# Altium schematic symbol library Schlib.SchLib: 725 symbols (part 4 of 6)
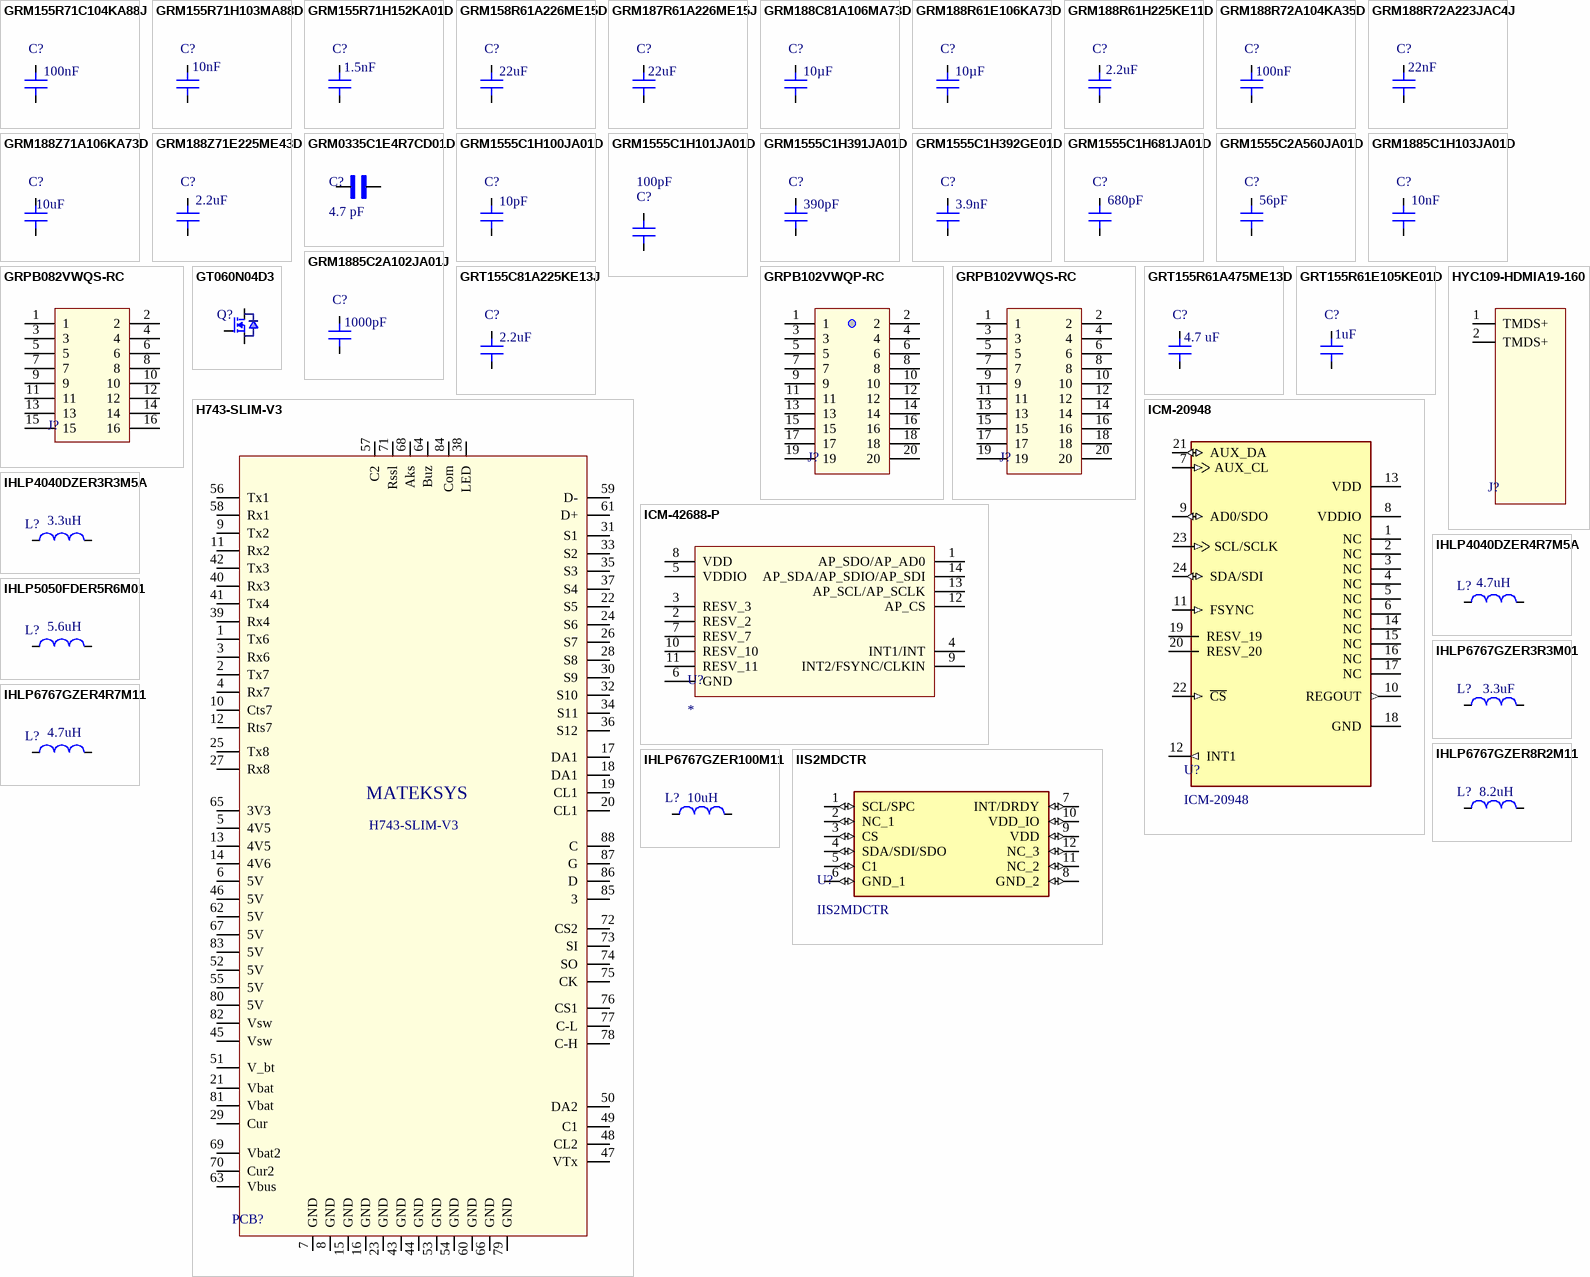
[diagram p24: symbols GRM155R71C104KA88J to IIS2MDCTR]

## GRT155R61A475ME13D
designator C?  value 4.7 uF  (hidden comment: *)
Cap, Aec-Q200, 4.7Uf, 10V, Mlcc, 0402 Rohs Compliant: Yes; Manufacturer: Murata; Manufacturer Part Number: GRT155R61A475ME13D; Supplier: Mouser; Supplier Part Number: 81-GRT155R61A475ME13; RoHS: Yes; Category: Ceramic Capacitors; Stock: 265246; Pricing: 1=0.16000, 10=0.07200, 50=0.07200, 100=0.04200, 1000=0.03300, 10000=0.02600 (USD); RoHS Compliant: Yes; Case/Package: 0402
footprint C 0402 (1005 Metric) (Chip Capacitor, Body 1.0x0.5mm, IPC High Density)
pins: 1 B, 2 A

## GRT155R61E105KE01D
designator C?  value 1uF  (hidden comment: *)
0402 1 uF 25 V ±10 % Tolerance X5R Surface Mount Multilayer Ceramic Capacitor; Manufacturer: Murata; Manufacturer Part Number: GRT155R61E105KE01D; Voltage Rating: 25V; Tolerance: 10%; Supplier: Digi-Key; Supplier Part Number: 490-12263-1-ND; RoHS: Yes; Category: Ceramic Capacitors; Stock: 639271; Pricing: 1=0.12000, 10=0.08400, 50=0.04780, 100=0.03950, 500=0.02772, 1000=0.02295, 2500=0.02136, 5000=0.01954 (USD); Mounting Technology: Surface Mount; Case/Package: 0402; Case Code (Metric): 1005; Case Code (Imperial): 0402; Min Operating Temperature: -55°C; Max Operating Temperature: 85°C; Packaging: Tape and Reel; Dielectric: X5R; Voltage Rating (DC): 25V; Length: 0.039inch; Width: 0.02inch; Thickness: 0.022inch; Ratings: AEC-Q200; RoHS Compliant: Yes; ComponentLink1URL: http://www.farnell.com/datasheets/2165918.pdf?src-supplier=Farnell; ComponentLink1Description: http://www.farnell.com/datasheets/2165918.pdf?src-supplier=Farnell; ComponentLink2URL: http://www.farnell.com/datasheets/2165918.pdf?src-supplier=Newark; ComponentLink2Description: http://www.farnell.com/datasheets/2165918.pdf?src-supplier=Newark; ComponentLink3URL: http://search.murata.co.jp/Ceramy/image/img/A01X/G101/ENG/GRT155R61E105KE01-01.pdf?src-supplier=Digi-Key; ComponentLink3Description: http://search.murata.co.jp/Ceramy/image/img/A01X/G101/ENG/GRT155R61E105KE01-01.pdf?src-supplier=Digi-Key; ComponentLink4URL: http://www.farnell.com/datasheets/2165918.pdf?src-supplier=Element14; ComponentLink4Description: http://www.farnell.com/datasheets/2165918.pdf?src-supplier=Element14
footprint C 0402 (1005 Metric) (Chip Capacitor, Body 1.0x0.5mm, IPC High Density)
pins: 1 B, 2 A

## GT060N04D3
designator Q?  (value not drawn)
N40V,RD(MAX)<6.5M@10V,RD(MAX)<10; Manufacturer: GoFord; Manufacturer Part Number: GT060N04D3; Supplier: Digi-Key; Supplier Part Number: 3141-GT060N04D3CT-ND; RoHS: No; Category: Uncategorized; Stock: 14940; Pricing: 1=0.75000, 10=0.66400, 100=0.50920, 500=0.40250, 1000=0.32200, 2000=0.29181 (USD); Case/Package: 8-PowerVDFN
pins: 1 S, 2 S, 3 S, 4 G, 5 D5, 6 D6, 7 D7, 8 D8

## H743-SLIM-V3
designator PCB?, comment MATEKSYS  (value not drawn)
MATEKSYS  Autopilot; Manufacturer Part Number: H743-SLIM-V3; Manufacturer: Matek
footprint Matek Flex board
pins: 1 Tx6, 2 Tx7, 3 Rx6, 4 Rx7, 5 4V5, 6 5V, 7 GND, 8 GND, 9 Tx2, 10 Cts7, 11 Rx2, 12 Rts7, 13 4V5, 14 4V6, 15 GND, 16 GND, 17 DA1, 18 DA1, 19 CL1, 20 CL1, 21 Vbat, 22 S5, 23 GND, 24 S6, 25 Tx8, 26 S7, 27 Rx8, 28 S8, 29 Cur, 30 S9, 31 S1, 32 S10, 33 S2, 34 S11, 35 S3, 36 S12, 37 S4, 38 LED, 39 Rx4, 40 Rx3, 41 Tx4, 42 Tx3, 43 GND, 44 GND, 45 Vsw, 46 5V, 47 VTx, 48 CL2, 49 C1, 50 DA2, 51 V_bt, 52 5V, 53 GND, 54 GND, 55 5V, 56 Tx1, 57 C2, 58 Rx1, 59 D-, 60 GND, 61 D+, 62 5V, 63 Vbus, 64 Buz, 65 3V3, 66 GND, 67 5V, 68 Aks, 69 Vbat2, 70 Cur2, 71 Rssl, 72 CS2, 73 SI, 74 SO, 75 CK, 76 CS1, 77 C-L, 78 C-H, 79 GND, 80 5V, 81 Vbat, 82 Vsw, 83 5V, 84 Com, 85 3, 86 D, 87 G, 88 C

## HYC109-HDMIA19-160
designator J?  (value not drawn)
HDMI Connector for PCB Male; Manufacturer Part Number: HYC109-HDMIA19-160
pins: 1 TMDS+, 2 TMDS+

## ICM-20948
designator U?
Accelerometer, Gyroscope, Magnetometer, 9 Axis Sensor I2C, SPI Output; Manufacturer Part Number: ICM-20948
footprint ICM-20948 (gyroscope)
pins: 1 NC, 2 NC, 3 NC, 4 NC, 5 NC, 6 NC, 7 AUX_CL (in), 8 VDDIO (power), 9 AD0/SDO (io), 10 REGOUT (out), 11 FSYNC (in), 12 INT1 (out), 13 VDD (power), 14 NC, 15 NC, 16 NC, 17 NC, 18 GND (power), 19 RESV_19, 20 RESV_20, 21 AUX_DA (io), 22 ~{CS} (in), 23 SCL/SCLK (in), 24 SDA/SDI (io)

## ICM-42688-P
designator U?
Accelerometer and Gyroscope 6-Axis MEMS Motion Tracking Device Digital-OUT 14-Pin LGA T/R; Manufacturer: TDK InvenSense; Manufacturer Part Number: ICM-42688-P; Sensor Type: Accelerometer,Gyroscope,6 Axis; Supplier: Rs; Supplier Part Number: 2182218; RoHS: No; Category: Inertial Measurement Units (IMUs); Stock: 58; Pricing: 2=7.075, 100=4.475, 500=3.79, 1000=3.69, 2500=3.6 (GBP); Series: -; ComponentLink1URL: https://media.digikey.com/pdf/Data%20Sheets/TDK%20PDFs/ICM-42688-P_DS_Rev1.2.pdf?src-supplier=Digi-Key; ComponentLink1Description: https://media.digikey.com/pdf/Data%20Sheets/TDK%20PDFs/ICM-42688-P_DS_Rev1.2.pdf?src-supplier=Digi-Key
footprint ICM-42688-P
pins: 1 AP_SDO/AP_AD0, 2 RESV_2, 3 RESV_3, 4 INT1/INT, 5 VDDIO, 6 GND, 7 RESV_7, 8 VDD, 9 INT2/FSYNC/CLKIN, 10 RESV_10, 11 RESV_11, 12 AP_CS, 13 AP_SCL/AP_SCLK, 14 AP_SDA/AP_SDIO/AP_SDI

## IHLP4040DZER3R3M5A
designator L?  value 3.3uH  (hidden comment: *)
Ind High Current Shielded Wirewound 3.3uH 20% 100KHz 11A 4040 T/R; Manufacturer: Vishay Dale; Manufacturer Part Number: IHLP4040DZER3R3M5A; Saturation Current: 12A; DC Resistance (DCR): 11.81mR; Supplier: Digi-Key; Supplier Part Number: 541-IHLP4040DZER3R3M5ACT-ND; RoHS: Yes; Category: Fixed Inductors; Stock: 750; Pricing: 1=1.60000, 10=1.48700, 25=1.37240, 50=1.14380, 100=1.07520, 250=0.96080 (USD); Mounting Technology: Surface Mount; Case/Package: 4040; Min Operating Temperature: -55°C; Max Operating Temperature: 125°C; Packaging: Tape and Reel; Package Quantity: 500; Tolerance: 20%; Current Rating: 11A; Shielding: Shielded; Max DC Current: 12A; Termination: SMD/SMT; Test Frequency: 100kHz; Series: IHLP-4040DZ-5A; Length: 0.425inch; Width: 10.3mm; Height: 4mm; Height - Seated (Max): 0.158inch; Depth: 10.3mm; Military Standard: Not; Lead Free: Lead Free; RoHS Compliant: Yes; ComponentLink1URL: https://datasheet.ciiva.com/15026/lp40dz5a-15026810.pdf?src-supplier=Digi-Key; ComponentLink1Description: https://datasheet.ciiva.com/15026/lp40dz5a-15026810.pdf?src-supplier=Digi-Key
footprint IHLP4040DZER3R3M5A (Precision Wire Wound Inductor, 2-Leads, Body 10.80x10.16mm, IPC Medium Density)
pins: 1 B, 2 A

## IHLP4040DZER4R7M5A
designator L?  value 4.7uH  (hidden comment: *)
Fixed Ind 4.7UH 9.8A 15.32 Mohm; Manufacturer: Vishay Dale; Manufacturer Part Number: IHLP4040DZER4R7M5A; Tolerance: 20%; Shielding: Shielded; Saturation Current: 9.2A; DC Resistance (DCR): 15.32mR; Test Frequency: 100kHz; Self Resonant Frequency: 20.1MHz; Supplier: Mouser; Supplier Part Number: 70-IHLP4040DZR4R7M5A; RoHS: Yes; Category: Fixed Inductors; Stock: 875; Pricing: 1=1.13, 10=0.927, 50=0.809, 100=0.763, 1000=0.605, 10000=0.547 (USD); Mounting Technology: Surface Mount; Case/Package: 4040; Min Operating Temperature: -55°C; Max Operating Temperature: 125°C; Packaging: Tape and Reel; Max DC Current: 9.2A; Termination: SMD/SMT; Series: IHLP-4040DZ-5A; Length: 10.92mm; Width: 10.3mm; Height: 4mm; Ratings: AEC-Q200; Lead Free: Lead Free; RoHS Compliant: Yes; ComponentLink1URL: https://datasheet.ciiva.com/15026/lp40dz5a-15026811.pdf?src-supplier=Digikey; ComponentLink1Description: https://datasheet.ciiva.com/15026/lp40dz5a-15026811.pdf?src-supplier=Digikey
footprint IHLP4040DZER4R7M5A (Precision Wire Wound Inductor, 2-Leads, Body 10.80x10.16mm, IPC Medium Density)
pins: 1 B, 2 A

## IHLP5050FDER5R6M01
designator L?  value 5.6uH  (hidden comment: *)
Inductor Power Shielded Wirewound 5.6uH 20% 100KHz Powdered Iron 13.5A 10mOhm DCR 5050 T/R; Manufacturer: Vishay; Manufacturer Part Number: IHLP5050FDER5R6M01; Supplier: Mouser; Supplier Part Number: 70-IHLP5050FDER5R6; RoHS: Yes; Category: Fixed Inductors; Stock: 1827; Pricing: 1=2.13, 10=1.59, 50=1.59, 100=1.14, 1000=0.996, 10000=0.996 (USD); ComponentLink1URL: https://datasheet.ciiva.com/3866/lp50fd01-3866012.pdf?src-supplier=Arrow+Electronics; ComponentLink1Description: https://datasheet.ciiva.com/3866/lp50fd01-3866012.pdf?src-supplier=Arrow+Electronics; ComponentLink2URL: https://datasheet.ciiva.com/16203/lp50fd01-16203837.pdf?src-supplier=Future+Electronics; ComponentLink2Description: https://datasheet.ciiva.com/16203/lp50fd01-16203837.pdf?src-supplier=Future+Electronics; ComponentLink3URL: https://datasheet.ciiva.com/22694/54939-22694507.pdf?src-supplier=Element14; ComponentLink3Description: https://datasheet.ciiva.com/22694/54939-22694507.pdf?src-supplier=Element14; ComponentLink4URL: https://datasheet.ciiva.com/8017/54939-8017423.pdf?src-supplier=Element14; ComponentLink4Description: https://datasheet.ciiva.com/8017/54939-8017423.pdf?src-supplier=Element14
footprint IHLP5050FDER5R6M01 (Precision Wire Wound Inductor, 2-Leads, Body 10.80x10.16mm, IPC Medium Density)
pins: 1 B, 2 A

## IHLP6767GZER3R3M01
designator L?  value 3.3uF  (hidden comment: *)
Inductor High Current Shielded Wirewound 3.3uH 20% 100KHz 28A 3.88mOhm DCR 6767 T/R; Manufacturer: Vishay Dale; Manufacturer Part Number: IHLP6767GZER3R3M01; Supplier: Mouser; Supplier Part Number: 70-IHLP6767GZER3R3M0; RoHS: Yes; Category: Fixed Inductors; Stock: 4019; Pricing: 1=4.06, 10=2.73, 50=2.73, 100=2.18, 1000=1.97, 10000=1.97 (USD); ComponentLink1URL: https://datasheet.ciiva.com/8017/482834-8017481.pdf?src-supplier=Element14; ComponentLink1Description: https://datasheet.ciiva.com/8017/482834-8017481.pdf?src-supplier=Element14; ComponentLink2URL: https://datasheet.ciiva.com/16299/lp67gz01-16299798.pdf?src-supplier=Future+Electronics; ComponentLink2Description: https://datasheet.ciiva.com/16299/lp67gz01-16299798.pdf?src-supplier=Future+Electronics
footprint IHLP6767GZER3R3M01 (Precision Wire Wound Inductor, 2-Leads, Body 10.80x10.16mm, IPC Medium Density)
pins: 1 B, 2 A

## IHLP6767GZER4R7M11
designator L?  value 4.7uH  (hidden comment: *)
Inductor High Current Shielded Wirewound 4.7uH 20% 100KHz 30A 4.18mOhm DCR 6767 T/R; Manufacturer: Vishay Dale; Manufacturer Part Number: IHLP6767GZER4R7M11; Supplier: Mouser; Supplier Part Number: 70-IHLP6767GZER4R7M1; RoHS: Yes; Category: Fixed Inductors; Stock: 1089; Pricing: 1=3.76, 10=2.65, 50=2.65, 100=2.34, 1000=2.15, 10000=2.15 (USD); ComponentLink1URL: https://datasheet.ciiva.com/7290/652622-7290288.pdf?src-supplier=Newark; ComponentLink1Description: https://datasheet.ciiva.com/7290/652622-7290288.pdf?src-supplier=Newark; ComponentLink2URL: https://datasheet.ciiva.com/1052/lp67gz11-1052670.pdf?src-supplier=Digikey; ComponentLink2Description: https://datasheet.ciiva.com/1052/lp67gz11-1052670.pdf?src-supplier=Digikey; ComponentLink3URL: https://datasheet.ciiva.com/1052/lp67gz11-1052671.pdf?src-supplier=Digikey; ComponentLink3Description: https://datasheet.ciiva.com/1052/lp67gz11-1052671.pdf?src-supplier=Digikey; ComponentLink4URL: https://datasheet.ciiva.com/1052/lp67gz11-1052672.pdf?src-supplier=Digikey; ComponentLink4Description: https://datasheet.ciiva.com/1052/lp67gz11-1052672.pdf?src-supplier=Digikey
footprint IHLP6767GZER4R7M11 (Precision Wire Wound Inductor, 2-Leads, Body 10.80x10.16mm, IPC Medium Density)
pins: 1 B, 2 A

## IHLP6767GZER8R2M11
designator L?  value 8.2uH  (hidden comment: *)
Inductor Power Shielded Wirewound 8.2uH 20% 100KHz Powdered Iron 21A 8.1mOhm DCR 6767 T/R; Manufacturer: Vishay Dale; Manufacturer Part Number: IHLP6767GZER8R2M11; ESR: 8.1mR; Supplier: Mouser; Supplier Part Number: 70-IHLP6767GZER8R2M1; RoHS: Yes; Category: Fixed Inductors; Stock: 1079; Pricing: 1=3.76, 10=2.65, 50=2.65, 100=2.11, 1000=1.92, 10000=1.92 (USD); ComponentLink1URL: https://datasheet.ciiva.com/11798/0900766b8102c93e-11798445.pdf?src-supplier=Rs; ComponentLink1Description: https://datasheet.ciiva.com/11798/0900766b8102c93e-11798445.pdf?src-supplier=Rs; ComponentLink2URL: https://datasheet.ciiva.com/8495/lp67gz11-8495789.pdf?src-supplier=Avnet; ComponentLink2Description: https://datasheet.ciiva.com/8495/lp67gz11-8495789.pdf?src-supplier=Avnet; ComponentLink3URL: https://datasheet.ciiva.com/1052/lp67gz11-1052757.pdf?src-supplier=Digikey; ComponentLink3Description: https://datasheet.ciiva.com/1052/lp67gz11-1052757.pdf?src-supplier=Digikey; ComponentLink4URL: https://datasheet.ciiva.com/1052/lp67gz11-1052758.pdf?src-supplier=Digikey; ComponentLink4Description: https://datasheet.ciiva.com/1052/lp67gz11-1052758.pdf?src-supplier=Digikey; ComponentLink5URL: https://datasheet.ciiva.com/1052/lp67gz11-1052759.pdf?src-supplier=Digikey; ComponentLink5Description: https://datasheet.ciiva.com/1052/lp67gz11-1052759.pdf?src-supplier=Digikey
footprint IHLP6767GZER8R2M11 (Precision Wire Wound Inductor, 2-Leads, Body 10.80x10.16mm, IPC Medium Density)
pins: 1 B, 2 A

## IHLP6767GZER100M11
designator L?  value 10uH  (hidden comment: *)
Inductor High Current Shielded Wirewound 10uH 20% 100KHz 19A 9.33mOhm DCR 6767 T/R; Manufacturer: Vishay Dale; Manufacturer Part Number: IHLP6767GZER100M11; Supplier: Mouser; Supplier Part Number: 70-IHLP6767GZER100M1; RoHS: Yes; Category: Fixed Inductors; Stock: 2320; Pricing: 1=3.74, 10=2.68, 50=2.68, 100=2.28, 1000=1.98, 10000=1.89 (USD); ComponentLink1URL: https://datasheet.ciiva.com/7290/1750656-7290283.pdf?src-supplier=Newark; ComponentLink1Description: https://datasheet.ciiva.com/7290/1750656-7290283.pdf?src-supplier=Newark; ComponentLink2URL: https://datasheet.ciiva.com/8495/lp67gz11-8495708.pdf?src-supplier=Avnet; ComponentLink2Description: https://datasheet.ciiva.com/8495/lp67gz11-8495708.pdf?src-supplier=Avnet; ComponentLink3URL: https://datasheet.ciiva.com/46386/1750656-46386780.pdf?src-supplier=Element14; ComponentLink3Description: https://datasheet.ciiva.com/46386/1750656-46386780.pdf?src-supplier=Element14; ComponentLink4URL: https://datasheet.ciiva.com/1052/lp67gz11-1052652.pdf?src-supplier=Digikey; ComponentLink4Description: https://datasheet.ciiva.com/1052/lp67gz11-1052652.pdf?src-supplier=Digikey; ComponentLink5URL: https://datasheet.ciiva.com/1052/lp67gz11-1052653.pdf?src-supplier=Digikey; ComponentLink5Description: https://datasheet.ciiva.com/1052/lp67gz11-1052653.pdf?src-supplier=Digikey; ComponentLink6URL: https://datasheet.ciiva.com/1052/lp67gz11-1052654.pdf?src-supplier=Digikey; ComponentLink6Description: https://datasheet.ciiva.com/1052/lp67gz11-1052654.pdf?src-supplier=Digikey; ComponentLink7URL: https://datasheet.ciiva.com/22710/1750656-22710508.pdf?src-supplier=Element14; ComponentLink7Description: https://datasheet.ciiva.com/22710/1750656-22710508.pdf?src-supplier=Element14
footprint IHLP6767GZER100M11 (Precision Wire Wound Inductor, 2-Leads, Body 10.80x10.16mm, IPC Medium Density)
pins: 1 B, 2 A

## IIS2MDCTR
designator U?
Magnetoresistive Sensor X, Y, Z Axis 12-LGA (2x2); Manufacturer Part Number: IIS2MDCTR
footprint IIS2MDCTR
pins: 1 SCL/SPC (io), 2 NC_1 (io), 3 CS (io), 4 SDA/SDI/SDO (io), 5 C1 (io), 6 GND_1 (io), 7 INT/DRDY (io), 8 GND_2 (io), 9 VDD (io), 10 VDD_IO (io), 11 NC_2 (io), 12 NC_3 (io)

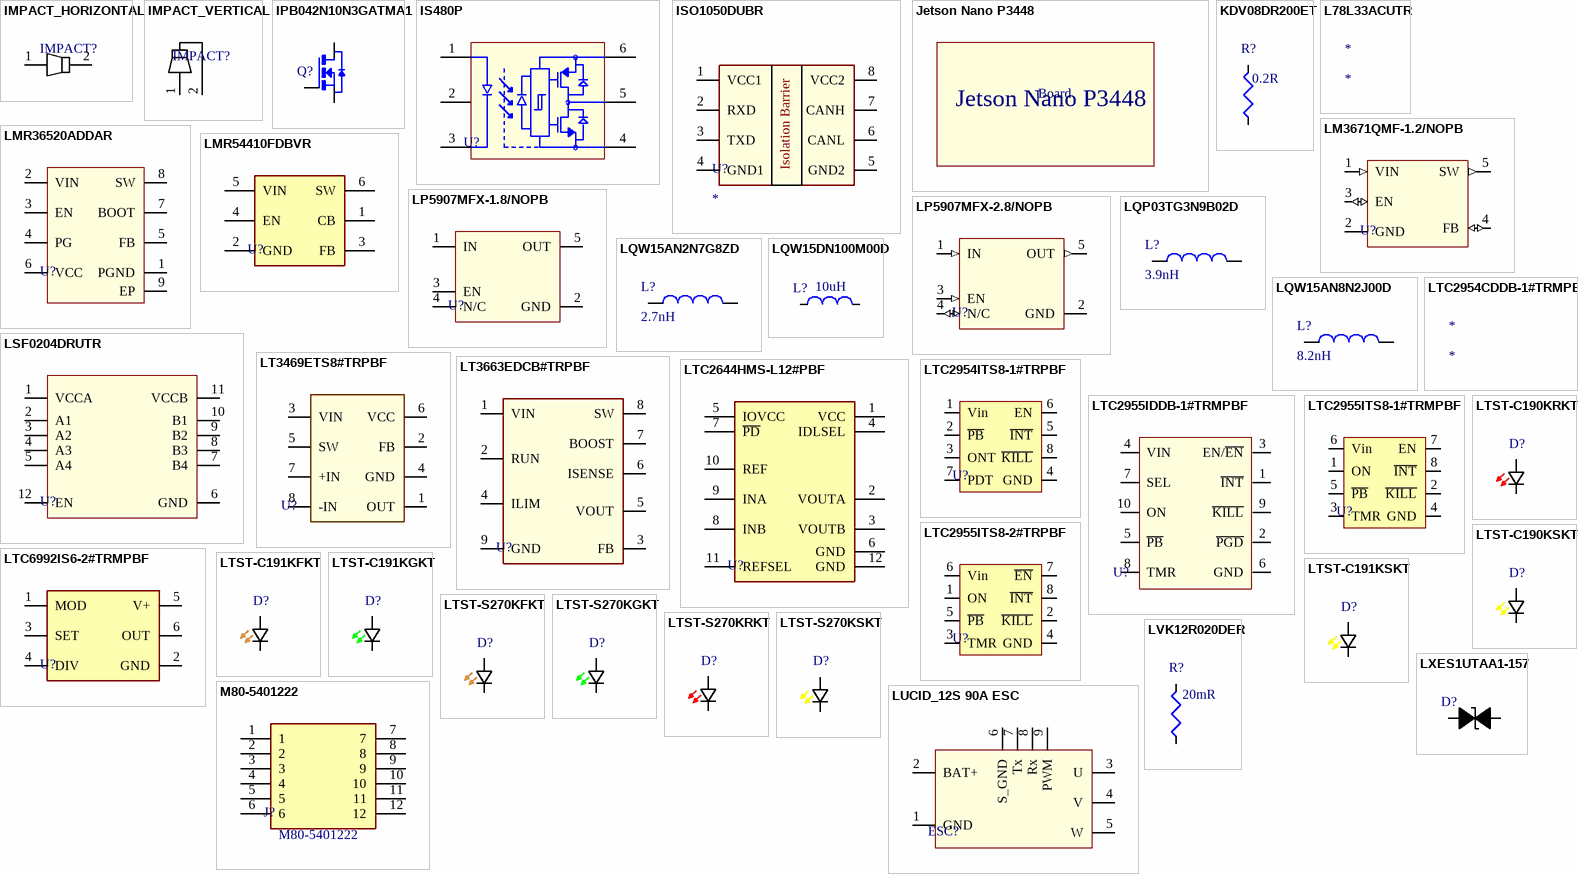
[diagram p13: symbols IMPACT_HORIZONTAL to M80-5401222]

## IMPACT_HORIZONTAL
designator IMPACT?  (value not drawn)
footprint Impact horizontal
pins: 1, 2

## IMPACT_VERTICAL
designator IMPACT?  (value not drawn)
footprint Impact vertical
pins: 1, 2

## IPB042N10N3GATMA1
designator Q?  (value not drawn)
Trans MOSFET N-CH 100V 100A Automotive 3-Pin(2+Tab) D2PAK T/R; Manufacturer: Infineon; Manufacturer Part Number: IPB042N10N3GATMA1; Number of Elements: 1; Power Dissipation: 214W; Gate to Source Voltage (Vgs): 20V; Rds On Max: 4.2mR; Input Capacitance: 8.41nF; Supplier: Mouser; Supplier Part Number: 726-IPB042N10N3GATMA; RoHS: Yes; Category: MOSFETs; Stock: 14892; Pricing: 1=2.6, 10=2.11, 50=2.11, 100=1.82, 1000=1.31, 10000=1.2 (USD); Mounting Technology: Surface Mount; Case/Package: TO-263; Min Operating Temperature: -55°C; Max Operating Temperature: 175°C; Packaging: Tape and Reel; Continuous Drain Current (ID): 100A; Max Dual Supply Voltage: 100V; Drain to Source Voltage (Vdss): 100V; Series: OptiMOS™; Max Power Dissipation: 214W; Radiation Hardening: No; RoHS Compliant: Yes; Lead Free: Contains Lead; Halogen Free: Halogen Free
footprint TO-263
pins: 1 G, 2 S, 3 D

## IS480P
designator U?  (value not drawn)
IS480P Series 5000 Vrms 0.5 V 145 mW SMT High Speed Photocoupler - SOIC-6; Manufacturer: Isocom; Number of Channels: 1; Propagation Delay: 220ns; Pulse Width Distortion (PWD): 120ns; High Level Output Current: 200mA; Forward Voltage: 1.33V; Supplier: Arrow Electronics; Supplier Part Number: IS480P; Manufacturer Part Number: IS480P; RoHS: Yes; Stock: 54; Pricing: 1=0.9844, 10=0.8112, 25=0.5527 (USD); Mounting Technology: Surface Mount; Case/Package: SOIC; Pins: 6; Min Operating Temperature: -40°C; Max Operating Temperature: 105°C; Packaging: Cut Tape; Low Level Output Current: 200mA; Series: -; ComponentLink1URL: http://isocom.com/wp-content/uploads/2017/08/IS480P_DC93200.pdf?src-supplier=Digikey; ComponentLink1Description: http://isocom.com/wp-content/uploads/2017/08/IS480P_DC93200.pdf?src-supplier=Digikey
footprint IS480P
pins: 1 ANODE, 2 NC, 3 CATHODE, 4 GND, 5 VOUT, 6 VCC

## ISO1050DUBR
designator U?
EAR99 ISO1050 Tape & Reel (TR) CANbus interface driver 5V 52mA 850.995985mg 74ns; Manufacturer: Texas Instruments; Manufacturer Part Number: ISO1050DUBR; Supplier: Mouser; Supplier Part Number: 595-ISO1050DUBR; RoHS: Yes; Category: Interface ICs; Stock: 32697; Pricing: 1=3.77, 10=3.2, 50=3.2, 100=2.78, 1000=2.35, 10000=1.88 (USD); ComponentLink1URL: https://datasheet.ciiva.com/1772/iso1050-1772416.pdf?src-supplier=Digikey; ComponentLink1Description: https://datasheet.ciiva.com/1772/iso1050-1772416.pdf?src-supplier=Digikey; ComponentLink2URL: https://datasheet.ciiva.com/1495/1772593-1495282.pdf?src-supplier=Element14; ComponentLink2Description: https://datasheet.ciiva.com/1495/1772593-1495282.pdf?src-supplier=Element14; ComponentLink3URL: https://datasheet.ciiva.com/1494/1882202-1494975.pdf?src-supplier=Element14; ComponentLink3Description: https://datasheet.ciiva.com/1494/1882202-1494975.pdf?src-supplier=Element14; ComponentLink4URL: https://datasheet.ciiva.com/28483/1882202-28483116.pdf?src-supplier=Element14; ComponentLink4Description: https://datasheet.ciiva.com/28483/1882202-28483116.pdf?src-supplier=Element14; ComponentLink5URL: https://datasheet.ciiva.com/26933/getdatasheetpartid-330373-26933436.pdf?src-supplier=Verical; ComponentLink5Description: https://datasheet.ciiva.com/26933/getdatasheetpartid-330373-26933436.pdf?src-supplier=Verical; ComponentLink6URL: https://datasheet.ciiva.com/1772/iso1050-1772417.pdf?src-supplier=Digikey; ComponentLink6Description: https://datasheet.ciiva.com/1772/iso1050-1772417.pdf?src-supplier=Digikey; ComponentLink7URL: https://datasheet.ciiva.com/41461/001187118-da-01-en-ic-txrx-can-5v-iso-iso1050dubr-sop-8-tid-41461850.pdf?src-supplier=Conrad; ComponentLink7Description: https://datasheet.ciiva.com/41461/001187118-da-01-en-ic-txrx-can-5v-iso-iso1050dubr-sop-8-tid-41461850.pdf?src-supplier=Conrad
footprint ISO1050DUBR
pins: 1 VCC1, 2 RXD, 3 TXD, 4 GND1, 5 GND2, 6 CANL, 7 CANH, 8 VCC2
text: Isolation Barrier

## Jetson Nano P3448
designator Board  (value not drawn)  (mechanical)

## KDV08DR200ET
designator R?  value 0.2R  (hidden comment: *)
Res 200M Ohm 0.5% 1/4W 0805; Manufacturer: Ohmite; Manufacturer Part Number: KDV08DR200ET; Supplier: Digikey; Supplier Part Number: 273-KDV08DR200ETCT-ND; RoHS: No; Category: Chip SMD Resistors; Stock: 19580; Pricing: 1=0.35, 10=0.285, 25=0.218, 50=0.1582, 100=0.1113, 250=0.09, 500=0.0709, 1000=0.04909 (USD); Case/Package: 0805
footprint R 0805
pins: 1 B, 2 A

## L78L33ACUTR
designator *
Linear Voltage Regulator IC Positive Fixed 1 Output 3.3V 100mA SOT-89-3; Manufacturer: STMicroelectronics; Manufacturer Part Number: L78L33ACUTR; Number of Outputs: 1; Max Supply Voltage: 30V; Dropout Voltage: 1.7V; Min Input Voltage: 5.3V; Quiescent Current: 6mA; Accuracy: 4%; Power Supply Rejection Ratio (PSRR): 49dB; Supplier: Digi-Key; Supplier Part Number: 497-1200-1-ND; RoHS: Yes; Category: Voltage Regulators - Linear; Stock: 136479; Pricing: 1=0.62000, 10=0.52800, 25=0.49240, 100=0.39400, 250=0.36584, 500=0.30954, 1000=0.23920 (USD); Mounting Technology: Surface Mount; Case/Package: SOT-89; Pins: 3; Weight: 0.01lb; Min Operating Temperature: 0°C; Max Operating Temperature: 125°C; Packaging: Tape and Reel; Package Quantity: 2500; Polarity: Positive; Series: -; Output Voltage: 3.3V; Output Current: 100mA; Max Output current: 100mA; Nominal Output Voltage: 3.3V; Number of Regulators: 1; Min Output Voltage: 3.3V; Output Voltage Accuracy: 4%; Output Type: Fixed; Output Configuration: Positive; Max Supply Current: 6mA; Length: 4.6mm; Width: 2.6mm; Height: 1.6mm; Radiation Hardening: No; Reach SVHC Compliant: Yes; Lead Free: Lead Free; RoHS Compliant: Yes; ComponentLink1URL: https://datasheet.ciiva.com/1512/1868798-1512347.pdf?src-supplier=Element14; ComponentLink1Description: https://datasheet.ciiva.com/1512/1868798-1512347.pdf?src-supplier=Element14; ComponentLink2URL: https://datasheet.ciiva.com/7992/1868798-7992606.pdf?src-supplier=Element14; ComponentLink2Description: https://datasheet.ciiva.com/7992/1868798-7992606.pdf?src-supplier=Element14; ComponentLink3URL: https://datasheet.ciiva.com/2041/cd00000446-2041927.pdf?src-supplier=Digi-Key; ComponentLink3Description: https://datasheet.ciiva.com/2041/cd00000446-2041927.pdf?src-supplier=Digi-Key; ComponentLink4URL: https://datasheet.ciiva.com/2041/cd00000446-2041926.pdf?src-supplier=Digi-Key; ComponentLink4Description: https://datasheet.ciiva.com/2041/cd00000446-2041926.pdf?src-supplier=Digi-Key; ComponentLink5URL: https://datasheet.ciiva.com/2041/cd00000446-2041928.pdf?src-supplier=Digi-Key; ComponentLink5Description: https://datasheet.ciiva.com/2041/cd00000446-2041928.pdf?src-supplier=Digi-Key; ComponentLink6URL: https://datasheet.ciiva.com/4882/cd00000446-4882331.pdf?src-supplier=Mouser; ComponentLink6Description: https://datasheet.ciiva.com/4882/cd00000446-4882331.pdf?src-supplier=Mouser; ComponentLink7URL: https://datasheet.ciiva.com/41439/001184652-da-01-en-ic-reg-ldo-3-3v-l78l33acutr-sot-89-3-stm-41439755.pdf?src-supplier=Conrad; ComponentLink7Description: https://datasheet.ciiva.com/41439/001184652-da-01-en-ic-reg-ldo-3-3v-l78l33acutr-sot-89-3-stm-41439755.pdf?src-supplier=Conrad

## LM3671QMF-1.2/NOPB
designator U?  (value not drawn)
IC REG BUCK 1.2V 0.6A SYNC SOT23; Manufacturer: Texas Instruments; Manufacturer Part Number: LM3671QMF-1.2/NOPB; Number of Outputs: 1; Output Current: 600mA; Min Input Voltage: 2.7V; Max Supply Voltage: 5.5V; Switching Frequency: 2MHz; Synchronous Rectifier: Yes; Quiescent Current: 1.7mA; Output Type: Fixed; Output Configuration: Positive; Supplier: Digi-Key; Supplier Part Number: 296-49720-1-ND; RoHS: Yes; Category: Voltage Regulators - Switching; Stock: 4673; Pricing: 1=2.00000, 10=1.79800, 25=1.69600, 100=1.44500, 250=1.35680, 500=1.18720 (USD); Mounting Technology: Surface Mount; Case/Package: SOT-23-5; Pins: 5; Min Operating Temperature: -40°C; Max Operating Temperature: 125°C; Packaging: Tape and Reel; Package Quantity: 1000; Output Voltage: 1.2V; Min Output Voltage: 1.2V; Series: Automotive, AEC-Q100; Lead Free: Lead Free; RoHS Compliant: Yes; ComponentLink1URL: https://datasheet.ciiva.com/6603/lm3671-6603941.pdf?src-supplier=Digi-Key; ComponentLink1Description: https://datasheet.ciiva.com/6603/lm3671-6603941.pdf?src-supplier=Digi-Key
footprint SOT-23-5
pins: 1 VIN (in), 2 GND (power), 3 EN (io), 4 FB (io), 5 SW (out)

## LMR36520ADDAR
designator U?  (value not drawn)
Switching Regulator, Current-mode, 2A, 460kHz Switching Freq-Max, PDSO8; Manufacturer: Texas Instruments; Manufacturer Part Number: LMR36520ADDAR; Max Duty Cycle: 98%; Max Supply Voltage: 65V; Min Supply Voltage: 4.2V; Nominal Supply Current: 26uA; Number of Channels: 1NUMBER; Supplier: Mouser; Supplier Part Number: 595-LMR36520ADDAR; RoHS: Yes; Category: Voltage Regulators - Switching; Stock: 4296; Pricing: 1=2.72, 10=2.39, 50=2.39, 100=1.96, 1000=1.34, 10000=1.2 (USD); Length: 4.89mm; Width: 3.9mm; Height: 1.7mm; Thickness: 1.48mm; ComponentLink1URL: http://www.ti.com/general/docs/suppproductinfo.tsp?distId=10&amp;gotoUrl=http%3A%2F%2Fwww.ti.com%2Flit%2Fgpn%2Flmr36520&src-supplier=Digikey; ComponentLink1Description: http://www.ti.com/general/docs/suppproductinfo.tsp?distId=10&amp;gotoUrl=http%3A%2F%2Fwww.ti.com%2Flit%2Fgpn%2Flmr36520&src-supplier=Digikey
footprint LMR36520ADDAR
pins: 1 PGND, 2 VIN, 3 EN, 4 PG, 5 FB, 6 VCC, 7 BOOT, 8 SW, 9 EP

## LMR54410FDBVR
designator U?  (value not drawn)
Switching Regulator, Current-mode, 1A, 1100kHz Switching Freq-Max, PDSO6; Manufacturer: Texas Instruments; Manufacturer Part Number: LMR54410FDBVR; Supplier: Mouser; Supplier Part Number: 595-LMR54410FDBVR; RoHS: No; Category: Voltage Regulators - Switching; Stock: 3120; Pricing: 1=1.06, 10=0.693, 50=0.693, 100=0.572, 1000=0.529, 10000=0.476 (USD); Case/Package: 926Case; Pins: 6NUMBER; Length: 2.9mm; Width: 1.6mm; Thickness: 1.2mm
footprint SOT-23-6
pins: 1 CB, 2 GND, 3 FB, 4 EN, 5 VIN, 6 SW

## LP5907MFX-1.8/NOPB
designator U?  (value not drawn)
Linear Voltage Regulator IC Positive Fixed 1 Output 1.8V 250mA SOT-23; Manufacturer: Texas Instruments; Manufacturer Part Number: LP5907MFX-1.8/NOPB; Min Input Voltage: 2.2V; Number of Outputs: 1; Dropout Voltage: 250mV; Max Supply Voltage: 5.5V; Quiescent Current: 25uA; Output Voltage Accuracy: 2%; Power Supply Rejection Ratio (PSRR): 60dB; Max Supply Current: 425uA; Supplier: Digi-Key; Supplier Part Number: 296-41463-1-ND; RoHS: Yes; Category: Voltage Regulators - Linear; Stock: 89212; Pricing: 1=0.69000, 10=0.59200, 25=0.55280, 100=0.44220, 250=0.41064, 500=0.34746, 1000=0.26850 (USD); Mounting Technology: Surface Mount; Case/Package: SOT-23-5; Pins: 5; Contact Plating: Tin; Min Operating Temperature: -40°C; Max Operating Temperature: 125°C; Packaging: Tape and Reel; Package Quantity: 3000; Output Voltage: 1.8V; Output Current: 250mA; Number of Regulators: 1; Nominal Output Voltage: 1.8V; Polarity: Positive; Accuracy: 2%; Max Output current: 250mA; Output Type: Fixed; Series: -; Output Configuration: Positive; Min Output Voltage: 1.8V; Reach SVHC Compliant: Yes; Lead Free: Lead Free; RoHS Compliant: Yes; ComponentLink1URL: https://datasheet.ciiva.com/15083/lp5907-15083594.pdf?src-supplier=Digi-Key; ComponentLink1Description: https://datasheet.ciiva.com/15083/lp5907-15083594.pdf?src-supplier=Digi-Key
footprint SOT-23-5
pins: 1 IN, 2 GND, 3 EN, 4 N/C, 5 OUT

## LP5907MFX-2.8/NOPB
designator U?  (value not drawn)
IC REG LDO 2.8V 0.25A SOT23-5; Manufacturer: Texas Instruments; Manufacturer Part Number: LP5907MFX-2.8/NOPB; Dropout Voltage: 120mV; Max Supply Voltage: 5.5V; Output Current: 250mA; Min Input Voltage: 2.2V; Number of Outputs: 1; Polarity: Positive; Quiescent Current: 25uA; Output Voltage Accuracy: 2%; Power Supply Rejection Ratio (PSRR): 82dB; Output Type: Fixed; Supplier: Digi-Key; Supplier Part Number: 296-39063-1-ND; RoHS: Yes; Category: Voltage Regulators - Linear; Stock: 17862; Pricing: 1=0.69000, 10=0.59200, 25=0.55280, 100=0.44220, 250=0.41064, 500=0.34746, 1000=0.26850 (USD); Mounting Technology: Surface Mount; Case/Package: SOT-23; Pins: 5; Min Operating Temperature: -40°C; Max Operating Temperature: 125°C; Output Voltage: 2.8V; Packaging: Tape and Reel; Package Quantity: 3000; Number of Regulators: 1; Lead Free: Lead Free; RoHS Compliant: Yes; ComponentLink1URL: https://media.digikey.com/pdf/Data%20Sheets/Texas%20Instruments%20PDFs/ConnectedSensorAutoSystemsGuide.pdf?src-supplier=Digi-Key; ComponentLink1Description: https://media.digikey.com/pdf/Data%20Sheets/Texas%20Instruments%20PDFs/ConnectedSensorAutoSystemsGuide.pdf?src-supplier=Digi-Key; ComponentLink2URL: http://www.ti.com/general/docs/suppproductinfo.tsp?distId=10&amp;gotoUrl=http%3A%2F%2Fwww.ti.com%2Flit%2Fgpn%2Flp5907&src-supplier=Digi-Key; ComponentLink2Description: http://www.ti.com/general/docs/suppproductinfo.tsp?distId=10&amp;gotoUrl=http%3A%2F%2Fwww.ti.com%2Flit%2Fgpn%2Flp5907&src-supplier=Digi-Key; ComponentLink3URL: http://www.ti.com/lit/gpn/lp5907?src-supplier=Mouser; ComponentLink3Description: http://www.ti.com/lit/gpn/lp5907?src-supplier=Mouser; ComponentLink4URL: http://www.ti.com/general/docs/lit/getliterature.tsp?genericPartNumber=LP5907&&fileType=pdf&src-supplier=Avnet; ComponentLink4Description: http://www.ti.com/general/docs/lit/getliterature.tsp?genericPartNumber=LP5907&&fileType=pdf&src-supplier=Avnet; ComponentLink5URL: http://www.ti.com/lit/ds/symlink/lp5907.pdf?src-supplier=Digi-Key; ComponentLink5Description: http://www.ti.com/lit/ds/symlink/lp5907.pdf?src-supplier=Digi-Key
footprint SOT-23-5
pins: 1 IN (in), 2 GND (power), 3 EN (in), 4 N/C (io), 5 OUT (out)

## LQP03TG3N9B02D
designator L?, comment 3.9nH
Inductor with Inductance: 3.9nH Tol. +/-0.1nH, Package: 0201 (0603); Manufacturer Part Number: LQP03TG3N9B02D
footprint INDC0603X33N
pins: 1, 2

## LQW15AN2N7G8ZD
designator L?, comment 2.7nH
Inductor with Inductance: 2.7nH Tol. +/-2%, Package: 0402 (1005); Manufacturer Part Number: LQW15AN2N7G8ZD
footprint LQW15AN2N7G8ZD
pins: 1, 2

## LQW15AN8N2J00D
designator L?, comment 8.2nH
Inductor with Inductance: 8.2nH Tol. +/-5%, Package: 0402 (1005); Manufacturer Part Number: LQW15AN8N2J00D
footprint INDC1006X60N
pins: 1, 2

## LQW15DN100M00D
designator L?  value 10uH  (hidden comment: *)
Inductor RF Chip Shielded Wirewound 10uH 20% 10MHz Ferrite 0.12A 5.405Ohm DCR 0402 T/R; Manufacturer: Murata; Manufacturer Part Number: LQW15DN100M00D; Saturation Current: 120mA; DC Resistance (DCR): 5.405R; Self Resonant Frequency: 20MHz; Supplier: Chip One Stop; Supplier Part Number: LQW15DN100M00D; RoHS: Yes; Category: Fixed Inductors; Stock: 78; Pricing: 10=21.4, 50=16.5 (JPY); Mounting Technology: Surface Mount; Case/Package: 0402; Core Material: Ferrite; Min Operating Temperature: -40°C; Max Operating Temperature: 85°C; Series: LQW15; Tolerance: 20%; Shielding: Shielded; Test Frequency: 10MHz; Current Rating: 120mA; Inductance Tolerance: 20%; RMS Current (Irms): 120mA; ESR: 5.405R; Height: 700um; RoHS Compliant: Yes; ComponentLink1URL: http://www.farnell.com/datasheets/2616941.pdf?src-supplier=Farnell; ComponentLink1Description: http://www.farnell.com/datasheets/2616941.pdf?src-supplier=Farnell; ComponentLink2URL: https://search.murata.co.jp/Ceramy/image/img/P02/JELF243A-0169.pdf?src-supplier=Digikey; ComponentLink2Description: https://search.murata.co.jp/Ceramy/image/img/P02/JELF243A-0169.pdf?src-supplier=Digikey
footprint L 0402
pins: 1 B, 2 A

## LSF0204DRUTR
designator U?  (value not drawn)
4-Bit Bidirectional Multi-Voltage Level Translator for Open-Drain & Push-Pull 12-UQFN -40 to 125; Manufacturer: Texas Instruments; Manufacturer Part Number: LSF0204DRUTR; Propagation Delay: 5.29ns; Max Supply Voltage: 5V; Min Supply Voltage: 0uV; Number of Circuits: 1; Operating Supply Current: 3.5uA; Number of Bits: 4; Supplier 1: Digi-Key; RoHS: Yes; Category: Voltage Level Shifters; Stock 1: 23358; Pricing 1: 1=1.13000, 10=1.01000, 25=0.95880, 100=0.78750, 250=0.73612, 500=0.65052, 1000=0.51357 (USD); Mount: Surface Mount; Number of Pins: 12; Min Operating Temperature: -40°C; Max Operating Temperature: 125°C; Packaging: Tape and Reel; Channel Type: Bidirectional; Number of Channels: 1; Logic Function: Translator; Quiescent Current: 3.5uA; Package Quantity: 3000; Lead Free: Lead Free; RoHS Compliant: Yes; ComponentLink1URL: http://www.ti.com/lit/ds/symlink/lsf0204d.pdf?src-supplier=Digi-Key; ComponentLink1Description: http://www.ti.com/lit/ds/symlink/lsf0204d.pdf?src-supplier=Digi-Key; ComponentLink2URL: http://www.ti.com/lit/gpn/lsf0204d?src-supplier=Mouser; ComponentLink2Description: http://www.ti.com/lit/gpn/lsf0204d?src-supplier=Mouser; ComponentLink3URL: http://www.ti.com/general/docs/lit/getliterature.tsp?genericPartNumber=LSF0204D&&fileType=pdf&src-supplier=Avnet; ComponentLink3Description: http://www.ti.com/general/docs/lit/getliterature.tsp?genericPartNumber=LSF0204D&&fileType=pdf&src-supplier=Avnet; Supplier Part Number 1: 296-40402-1-ND
footprint LSF0204RUTR
pins: 1 VCCA, 2 A1, 3 A2, 4 A3, 5 A4, 6 GND (power), 7 B4, 8 B3, 9 B2, 10 B1, 11 VCCB, 12 EN

## LT3469ETS8#TRPBF
designator U?  (value not drawn)
IC TRANSCONDUCTANCE TSOT23-8 "Transconductance IC Piezo Speakers, Microactuators TSOT-23-8"; Manufacturer: Analog Devices; Manufacturer Part Number: LT3469ETS8#TRPBF; Manufacturer Lifecycle Status: PRODUCTION; Number of Outputs: 1; Supplier: Farnell; Supplier Part Number: 4021943; RoHS: Compliant; Category: Amplifiers - Op Amps, Buffer, Instrumentation; Stock: 2245; Pricing: 1=5.75, 10=3.83, 25=3.32, 100=2.75, 250=2.47, 500=2.32 (GBP); Case/Package: SOT-23-8; Lead Free: Lead Free; Length: 2.9mm; Lifecycle Status: Production; Max Operating Temperature: 85°C; Min Operating Temperature: -40°C; Pins: 8; Packaging: Tape and Reel; ComponentLink1URL: https://datasheet.octopart.com:443/LT3469ETS8%23TRPBF-Analog-Devices-datasheet-13519339.pdf?src-supplier=Upverter; ComponentLink1Description: https://datasheet.octopart.com:443/LT3469ETS8%23TRPBF-Analog-Devices-datasheet-13519339.pdf?src-supplier=Upverter; ComponentLink2URL: https://octopart.com:443/opatz8j6/c1?t=w4tr_7dAu7EmD8krqpckyc9One-U1ZQHxNSlIX1jhrFSybaOgosJ6BDB-uXAFwqhucfNYcWv_5Zi12bOnWV_1GTJrFiC0tCQJbIysakwcFo87V0dnXBkHMSJsMnKKeVDm9INdmr9ueJw4KD4PLDaZleP4kqbfCdXfECQ_5lyMZ5qrEuqMsyj8OqKsBeckgAJpVj1l-jp9_JUOIXL8Y9dqIA5oB4ed0Njc9BgNrkfBslHRGu7mKVhltWElUhKLaQp862ggYi3SkXgpUKJktVls9jncsfAKP8SGLtXX0jDnVP5EcPLxY0QzA&src-supplier=Analog+Devices; ComponentLink2Description: https://octopart.com:443/opatz8j6/c1?t=w4tr_7dAu7EmD8krqpckyc9One-U1ZQHxNSlIX1jhrFSybaOgosJ6BDB-uXAFwqhucfNYcWv_5Zi12bOnWV_1GTJrFiC0tCQJbIysakwcFo87V0dnXBkHMSJsMnKKeVDm9INdmr9ueJw4KD4PLDaZleP4kqbfCdXfECQ_5lyMZ5qrEuqMsyj8OqKsBeckgAJpVj1l-jp9_JUOIXL8Y9dqIA5oB4ed0Njc9BgNrkfBslHRGu7mKVhltWElUhKLaQp862ggYi3SkXgpUKJktVls9jncsfAKP8SGLtXX0jDnVP5EcPLxY0QzA&src-supplier=Analog+Devices; ComponentLink3URL: https://sigma.octopart.com:443/57695445/technical_drawing/Linear-Technology-LT3469ETS8%23TRPBF.pdf?src-supplier=Linear+Technology; ComponentLink3Description: https://sigma.octopart.com:443/57695445/technical_drawing/Linear-Technology-LT3469ETS8%23TRPBF.pdf?src-supplier=Linear+Technology; ComponentLink4URL: http://sigma.octopart.com:80/conflict_mineral_statement/Analog-Devices-company-33.pdf?src-supplier=Compliance+Statements; ComponentLink4Description: http://sigma.octopart.com:80/conflict_mineral_statement/Analog-Devices-company-33.pdf?src-supplier=Compliance+Statements; ComponentLink5URL: https://octopart.com:443/opatz8j6/c1?t=WCNEVmZxG_XsAzxJ4qXLnN8Vo-lsrZYwsNewIrR7dTPdaC69ytnmPVryZPBFowmDRRFFoxXECa8ZPz4qVw_AxYF7x9JLBgpQn0qJ-d7UbIrKtsIBh9ZUHJKDIlStzSgnL3TouTFzQzsvG-CGzEAIstvFTiUzOOa-Oqd53MFvMBAmmsrzxY1ZqmCk8P1K8EMgQzEc7oUvHmf0qH-ps1JbWyMoAmK38golGZG04qoSQTB2_bUYxMYAohtf7TR9zeyPu-I90JRg0fBBWOyABPilVlawC67ssarB8yzPkAUQNLNr_ZlInCBq8w&src-supplier=Compliance+Statements; ComponentLink5Description: https://octopart.com:443/opatz8j6/c1?t=WCNEVmZxG_XsAzxJ4qXLnN8Vo-lsrZYwsNewIrR7dTPdaC69ytnmPVryZPBFowmDRRFFoxXECa8ZPz4qVw_AxYF7x9JLBgpQn0qJ-d7UbIrKtsIBh9ZUHJKDIlStzSgnL3TouTFzQzsvG-CGzEAIstvFTiUzOOa-Oqd53MFvMBAmmsrzxY1ZqmCk8P1K8EMgQzEc7oUvHmf0qH-ps1JbWyMoAmK38golGZG04qoSQTB2_bUYxMYAohtf7TR9zeyPu-I90JRg0fBBWOyABPilVlawC67ssarB8yzPkAUQNLNr_ZlInCBq8w&src-supplier=Compliance+Statements
footprint TSOT-23-8
pins: 1 OUT, 2 FB, 3 VIN, 4 GND, 5 SW, 6 VCC, 7 +IN, 8 -IN

## LT3663EDCB#TRPBF
designator U?  (value not drawn)
.2A, 1.5MHz Step Down Switching Regulator with Programmable Output Current Limit; Manufacturer: Analog Devices / Linear Technology; Manufacturer Part Number: LT3663EDCB#TRPBF; Number of Outputs: 1; Output Voltage: 5.5V; Output Current: 1.2A; Synchronous Rectifier: No; Output Type: Adjustable; Supplier: Mouser; Supplier Part Number: 584-LT3663EDCB#TRPBF; RoHS: Yes; Category: Voltage Regulators - Switching; Stock: 990; Pricing: 1=8.56, 10=5.82, 50=5.08, 100=4.25, 1000=3.77, 10000=3.76 (USD); Case/Package: DFN; Pins: 8; Min Operating Temperature: -40°C; Max Operating Temperature: 125°C; Package Quantity: 2500; Packaging: Tape and Reel; Switching Frequency: 1.5MHz; Series: -; RoHS Compliant: Yes; ComponentLink1URL: https://datasheet.ciiva.com/4119/48401570s8422796n7433-4119313.pdf?src-supplier=Arrow+Electronics; ComponentLink1Description: https://datasheet.ciiva.com/4119/48401570s8422796n7433-4119313.pdf?src-supplier=Arrow+Electronics; ComponentLink2URL: https://datasheet.ciiva.com/2031/28442-2031873.pdf?src-supplier=Digikey; ComponentLink2Description: https://datasheet.ciiva.com/2031/28442-2031873.pdf?src-supplier=Digikey
footprint LT3663EDCB#TRPBF
pins: 1 VIN, 2 RUN, 3 FB, 4 ILIM, 5 VOUT, 6 ISENSE, 7 BOOST, 8 SW, 9 GND

## LTC2644HMS-L12#PBF
designator U?  (value not drawn)
DAC 2-CH 12-bit Automotive 12-Pin MSOP Tube; Manufacturer: Analog Devices / Linear Technology; Manufacturer Part Number: LTC2644HMS-L12#PBF; Supplier: Farnell; Supplier Part Number: 4018170; RoHS: Yes; Category: Digital to Analog Converters (DACs); Stock: 69; Pricing: 1=7.5, 10=5.42, 37=4.63, 111=4.43, 259=4.34, 518=4.25 (EUR); ComponentLink1URL: http://www.linear.com/docs/45234?src-supplier=Digikey; ComponentLink1Description: http://www.linear.com/docs/45234?src-supplier=Digikey; ComponentLink2URL: https://datasheet.octopart.com/LTC2644HMS-L12%23PBF-Analog-Devices-datasheet-165827086.pdf?src-supplier=Element14; ComponentLink2Description: https://datasheet.octopart.com/LTC2644HMS-L12%23PBF-Analog-Devices-datasheet-165827086.pdf?src-supplier=Element14
footprint LTC2644HMS-L12#PBF
pins: 1 VCC, 2 VOUTA, 3 VOUTB, 4 IDLSEL, 5 IOVCC, 6 GND, 7 ~{PD}, 8 INB, 9 INA, 10 REF, 11 REFSEL, 12 GND

## LTC2954CDDB-1#TRMPBF
designator *
LTC2954 - Push Button On/Off Controller with µP Interrupt; Manufacturer: Analog Devices / Linear Technology; Manufacturer Part Number: LTC2954CDDB-1#TRMPBF; Operating Supply Current: 6uA; Supplier: Mouser; Supplier Part Number: 584-C2954CDDB-1TMPF; RoHS: Yes; Category: Voltage Supervisors; Stock: 698; Pricing: 1=5.75, 10=4.89, 50=4.89, 100=4.24, 1000=3.03, 10000=2.88 (USD); Case/Package: DFN EP; Pins: 8; Min Operating Temperature: 0°C; Max Operating Temperature: 70°C; Package Quantity: 500; Packaging: Tape and Reel; Radiation Hardening: No; Lead Free: Lead Free; RoHS Compliant: Yes; ComponentLink1URL: https://datasheet.ciiva.com/15134/getdatasheetpartid-369007-15134872.pdf?src-supplier=Verical; ComponentLink1Description: https://datasheet.ciiva.com/15134/getdatasheetpartid-369007-15134872.pdf?src-supplier=Verical; ComponentLink2URL: https://datasheet.ciiva.com/1967/16598-1967282.pdf?src-supplier=Digikey; ComponentLink2Description: https://datasheet.ciiva.com/1967/16598-1967282.pdf?src-supplier=Digikey; ComponentLink3URL: https://datasheet.ciiva.com/1967/16598-1967283.pdf?src-supplier=Digikey; ComponentLink3Description: https://datasheet.ciiva.com/1967/16598-1967283.pdf?src-supplier=Digikey; ComponentLink4URL: https://datasheet.ciiva.com/1967/16598-1967284.pdf?src-supplier=Digikey; ComponentLink4Description: https://datasheet.ciiva.com/1967/16598-1967284.pdf?src-supplier=Digikey; ComponentLink5URL: https://datasheet.ciiva.com/48696/001256188-da-01-en-ic-push-b-ltc2954cddb-1-trmpbf-dfn-8-ltc-48696487.pdf?src-supplier=Conrad; ComponentLink5Description: https://datasheet.ciiva.com/48696/001256188-da-01-en-ic-push-b-ltc2954cddb-1-trmpbf-dfn-8-ltc-48696487.pdf?src-supplier=Conrad